# Altium footprint library LCD.PcbLib: 21 footprints (part 2 of 2)
Each footprint in its own frame and in the unit in brackets; x right, y up, seen from the top. Pads: shape width x height; smd on the part's side, far side on the other; paste and mask are expansions set on the pad; w line width, h text height; cw(c..) or ccw(c..) is an arc to the next point about the centre after c.
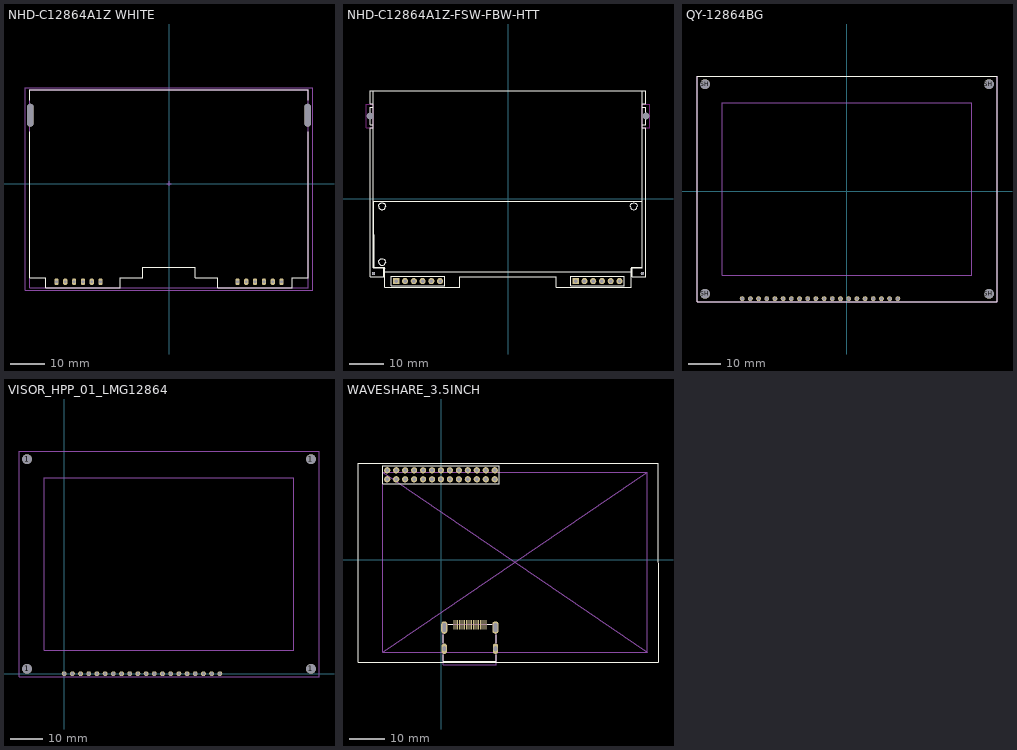
[diagram p1: the footprints below, top view; thin cyan lines are the x and y axes]

## NHD-C12864A1Z WHITE [mm]
height 7
pads (14):
  oval 1.2x2 hole 0.8: 1(-32.38,-28.2) 2(-29.84,-28.2) 3(-27.3,-28.2) 4(-24.76,-28.2) 5(-22.22,-28.2) 6(-19.68,-28.2) 7(19.68,-28.2) 8(22.22,-28.2) 9(24.76,-28.2) 10(27.3,-28.2) 11(29.84,-28.2) 12(32.38,-28.2)
  oval 1.8x6.5 hole 1.8 slot 6.5 at 90 deg unplated: M(-39.9,19.7) M(39.9,19.7)
Top Overlay:
  lines w0.2: -40,15 -40,-27 -35.5,-27 -35.5,-30 -14,-30 -14,-27 -7.5,-27 -7.5,-24 0,-24 7.5,-24 7.5,-27 14,-27 14,-30 35.5,-30 35.5,-27 40,-27 40,15 ; -40,24 -40,27 0,27 40,27 40,24
Mechanical 13:
  lines w0.2: -40,-30 40,-30 40,27 -40,27 -40,-30
Mechanical 15:
  lines w0.2: -0.635,0 0.635,0 ; 0,-0.635 0,0.635 ; -41.402,-30.607 41.402,-30.607 41.402,27.559 -41.402,27.559 -41.402,-30.607
3D body "NHD-C12864A1Z WHITE.STEP": height 7, standoff -6.6, extent -40,-30 40,27

## NHD-C12864A1Z-FSW-FBW-HTT [mil]
pads (16):
  rect 70x70 hole 39.37: 1(-1275.95,-942.88) 7(773.05,-942.88)
  round 70 hole 39.37: 2(-1175.95,-942.88) 3(-1075.95,-942.88) 4(-975.95,-942.88) 5(-875.95,-942.88) 6(-775.95,-942.88) 8(873.05,-942.88) 9(973.05,-942.88) 10(1073.05,-942.88) 11(1173.05,-942.88) 12(1273.05,-942.88)
  round 0 hole 81.38 square: B(-1576.5,942.88) B(1576.5,942.87)
  round 0 hole 31.5: B(-1536.13,-855.76) B(1534.74,-855.76)
Top Overlay:
  drawing of 223 lines, arcs and shapes, not listed
Keep-Out Layer:
  lines w5: -1617.5,806.24 -1617.5,1079.24 -1536.13,1079.24 -1536.13,806.24 -1617.5,806.24 ; 1534.74,806.24 1534.74,1079.24 1616.11,1079.24 1616.11,806.24 1534.74,806.24
3D body "NHD-C12864A1Z-FSW-FBW-HTT.STEP": height 276.09, standoff -438.48, extent -1575.75,-1012.92 1573.86,1231.17

## QY-12864BG [mm]
pads (24):
  round 1.5 / inner round 1.524 / far side round 1.5 hole 1: 1(15.76,-33.25) 2(13.22,-33.25) 3(10.68,-33.25) 4(8.14,-33.25) 5(5.6,-33.25) 6(3.06,-33.25) 7(0.52,-33.25) 8(-2.02,-33.25) 9(-4.56,-33.25) 10(-7.1,-33.25) 11(-9.64,-33.25) 12(-12.18,-33.25) 13(-14.72,-33.25) 14(-17.26,-33.25) 15(-19.8,-33.25) 16(-22.34,-33.25) 17(-24.88,-33.25) 18(-27.42,-33.25) 19(-29.96,-33.25) 20(-32.5,-33.25)
  round 3 hole 3 unplated: SH(-44,-31.749) SH(-44,33.25) SH(43.999,-31.749) SH(44,33.25)
Top Overlay:
  lines w0.254: -46.47,-34.266 -46.47,35.711 46.494,35.711 46.494,-34.266 -46.47,-34.266
Mechanical 22:
  lines w0: -46.5,-34.25 -46.5,-32.25
  lines w0.127: -46.5,-34.25 46.5,-34.25 46.5,35.75 -46.5,35.75 -46.5,-32.25
Mechanical 35:
  lines w0.127: -38.601,-25.999 -38.601,27.501 38.599,27.501 38.599,-25.999 -38.601,-25.999

## VISOR_HPP_01_LMG12864 [mm]
pads (24):
  round 3 hole 3 unplated: 1(-11.5,1.501) 1(-11.5,66.5) 1(76.499,1.501) 1(76.5,66.5)
  round 1.5 / inner round 1.524 / far side round 1.5 hole 1: CSA(12.7,0) CSB(10.16,0) DT0(33.02,0) DT1(30.48,0) DT2(27.94,0) DT3(25.4,0) DT4(22.86,0) DT5(20.32,0) DT6(17.78,0) DT7(15.24,0) E(35.56,0) LEDA(2.54,0) LEDK(0,0) RS(40.64,0) RST(7.62,0) RW(38.1,0) V0(43.18,0) VDD(45.72,0) VOUT(5.08,0) VSS(48.26,0)
Mechanical 22:
  lines w0: -14,-1 -14,1
  lines w0.127: -14,-1 79,-1 79,69 -14,69 -14,1
Mechanical 35:
  lines w0.127: -6.101,7.25 -6.101,60.75 71.099,60.75 71.099,7.25 -6.101,7.25

## WAVESHARE_3.5INCH [mm] "3.5Inch HDMI LCD XPT2046"
pads (49):
  rect 0.28x2.6 smd: 1(12.59,-18.476) 2(12.09,-18.476) 3(11.59,-18.476) 4(11.09,-18.476) 5(10.59,-18.476) 6(10.09,-18.476) 7(9.59,-18.476) 8(9.09,-18.476) 9(8.59,-18.476) 10(8.09,-18.476) 11(7.59,-18.476) 12(7.09,-18.476) 13(6.59,-18.476) 14(6.09,-18.476) 15(5.59,-18.476) 16(5.09,-18.476) 17(4.59,-18.476) 18(4.09,-18.476) 19(3.59,-18.476)
  round 1.778 hole 1: P1(-15.34,22.736) P2(-15.34,25.276) P3(-12.8,22.736) P4(-12.8,25.276) P5(-10.26,22.736) P6(-10.26,25.276) P7(-7.72,22.736) P8(-7.72,25.276) P9(-5.18,22.736) P10(-5.18,25.276) P11(-2.64,22.736) P12(-2.64,25.276) P13(-0.1,22.736) P14(-0.1,25.276) P15(2.44,22.736) P16(2.44,25.276) P17(4.98,22.736) P18(4.98,25.276) P19(7.52,22.736) P20(7.52,25.276) P21(10.06,22.736) P22(10.06,25.276) P23(12.6,22.736) P24(12.6,25.276) P25(15.14,22.736) P26(15.14,25.276)
  oval 1.778x3.556 hole 0.9 slot 2.5 at 90 deg: SH1(0.84,-19.276) SH2(15.34,-19.276)
  oval 1.5x3 hole 0.9 slot 1.3 at 90 deg: SH3(0.84,-25.276) SH4(15.34,-25.276)
Top Overlay:
  lines w0.051: -16.61,21.466 16.41,21.466 ; -16.61,21.466 -16.61,26.546 ; -16.61,21.466 16.41,21.466 ; -16.61,21.466 -16.61,26.546 ; -16.61,26.546 16.41,26.546 ; -16.61,26.546 16.41,26.546 ; 16.41,21.466 16.41,26.546 ; 16.41,21.466 16.41,26.546
  lines w0.127: 0.59,-26.976 0.59,-28.826 15.59,-28.826 15.59,-26.976 ; 0.59,-23.576 0.59,-21.276 ; 1.97,-18.326 3.23,-18.326 ; 12.96,-18.326 14.22,-18.326 ; 15.59,-23.576 15.59,-21.276 ; -23.61,-29.094 -23.61,27.346 61.39,27.346 61.39,-29.094 -23.61,-29.094
Mechanical 1:
  lines w0.127: 0.39,-26.106 ccw(c0.61,-26.106) 0.61,-26.326 1.07,-26.326 ccw(c1.07,-26.106) 1.29,-26.106 1.29,-24.446 ccw(c1.07,-24.446) 1.07,-24.226 0.61,-24.226 ccw(c0.61,-24.446) 0.39,-24.446 0.39,-26.106 ; 0.39,-20.416 ccw(c0.6,-20.416) 0.6,-20.626 1.08,-20.626 ccw(c1.08,-20.416) 1.29,-20.416 1.29,-18.136 ccw(c1.08,-18.136) 1.08,-17.926 0.6,-17.926 ccw(c0.6,-18.136) 0.39,-18.136 0.39,-20.416 ; 14.89,-26.106 ccw(c15.11,-26.106) 15.11,-26.326 15.57,-26.326 ccw(c15.57,-26.106) 15.79,-26.106 15.79,-24.446 ccw(c15.57,-24.446) 15.57,-24.226 15.11,-24.226 ccw(c15.11,-24.446) 14.89,-24.446 14.89,-26.106 ; 14.89,-20.416 ccw(c15.1,-20.416) 15.1,-20.626 15.58,-20.626 ccw(c15.58,-20.416) 15.79,-20.416 15.79,-18.136 ccw(c15.58,-18.136) 15.58,-17.926 15.1,-17.926 ccw(c15.1,-18.136) 14.89,-18.136 14.89,-20.416
Mechanical 4:
  lines w0.127: -16.61,-26.248 58.375,24.679 ; -16.625,24.679 -16.61,24.679 58.375,-26.248 ; -16.625,24.679 -16.625,-26.248 58.375,-26.248 ; -16.625,24.679 58.375,24.679 ; 0.59,-29.876 15.59,-29.876 ; 0.59,-29.876 0.59,-28.826 ; 0.59,-29.876 15.59,-29.876 ; 0.59,-29.876 0.59,-28.826 ; 0.59,-28.826 0.59,-18.326 ; 0.59,-28.826 15.59,-28.826 ; 0.59,-28.826 0.59,-18.326 ; 0.59,-28.826 15.59,-28.826 ; 0.59,-18.326 15.59,-18.326 ; 0.59,-18.326 15.59,-18.326 ; 15.59,-29.876 15.59,-28.826 ; 15.59,-29.876 15.59,-28.826 ; 15.59,-28.826 15.59,-18.326 ; 15.59,-28.826 15.59,-18.326 ; 58.375,-26.248 58.375,24.679
3D body "modelado pantalla 2.stp": height 22.2, standoff -1.62, extent -24.636,-36.865 61.364,27.765
3D body "User Library-PLD-26.step": height 8.4, standoff -3, extent -16.61,21.506 16.41,26.506